# Altium integrated library myCPU_Components.IntLib: 73 symbols
Pins are listed as number, name and electrical type; pins without a type are passive.

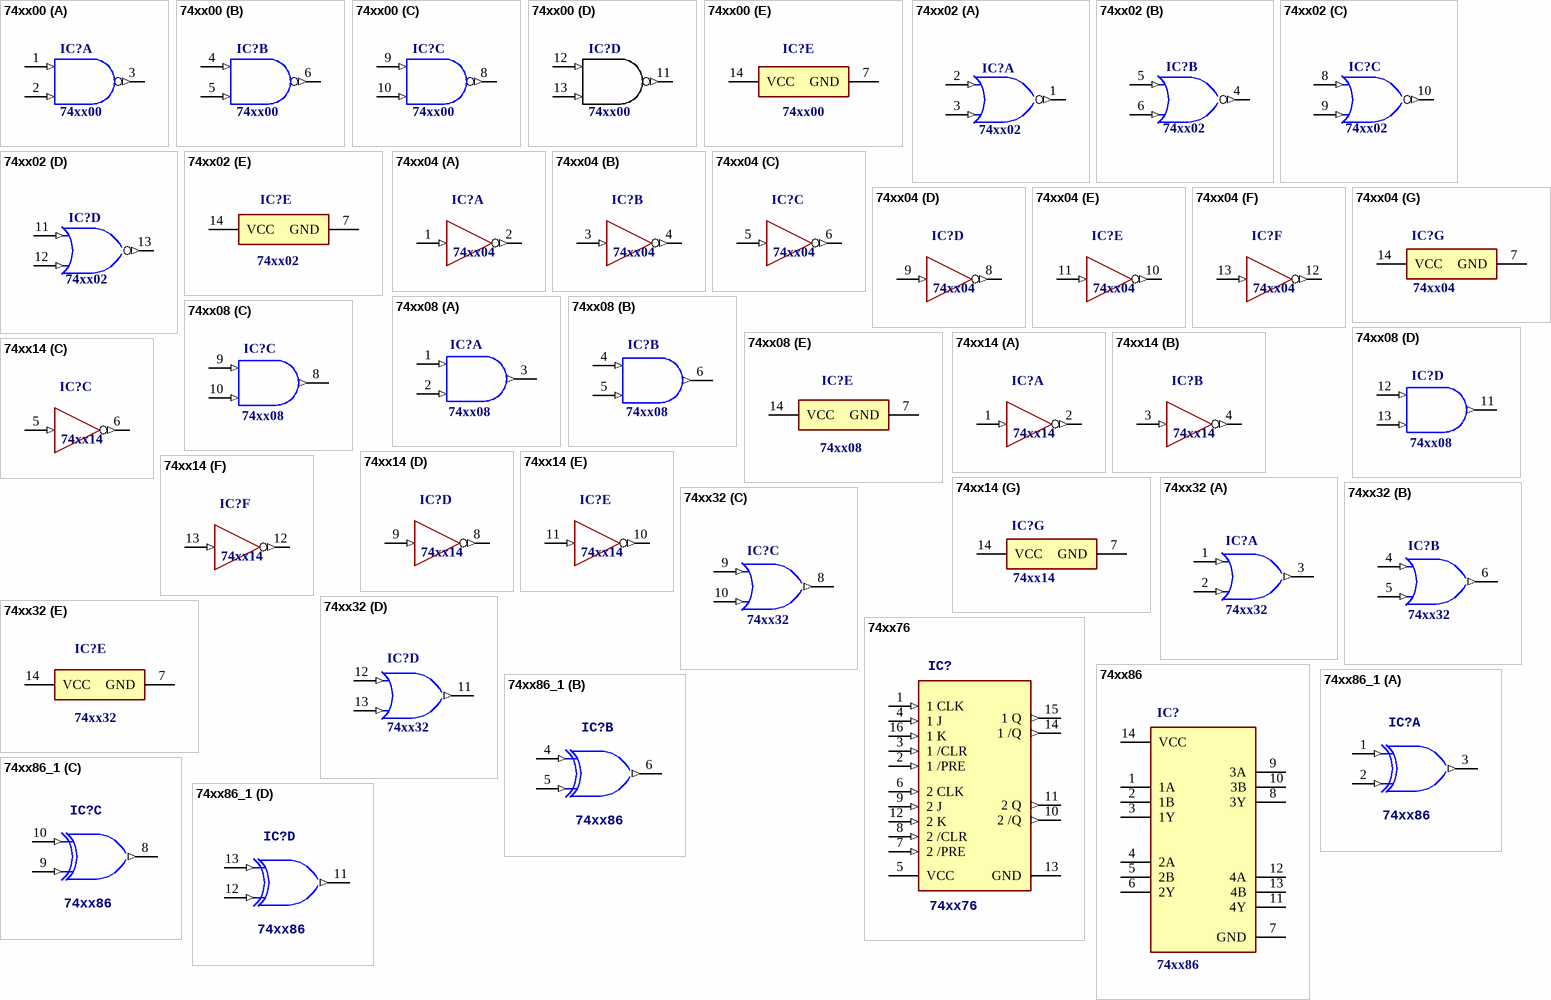
[diagram p0: symbols 74xx00 to 74xx86_1]

## 74xx00
designator IC?
Quad 2-input NAND gates; Value: 74xx00
footprint Generic_DIP14
part A pins: 1 1A (in) "Gate 1 input", 2 1B (in) "Gate 1 input", 3 1Y (out) "Gate 1 output"
part B pins: 4 2A (in) "Gate 2 input", 5 2B (in) "Gate 2 input", 6 2Y (out) "Gate 2 output"
part C pins: 8 3Y (out) "Gate 3 output", 9 3A (in) "Gate 3 input", 10 3B (in) "Gate 3 input"
part D pins: 11 4Y (out) "Gate 4 output", 12 4A (in) "Gate 4 input", 13 4B (in) "Gate 4 input"
part E pins: 7 GND (power) "Ground Pin", 14 VCC (power) "Power Pin"

## 74xx02
designator IC?
Quad 2-input NOR gates; Value: 74xx02
footprint Generic_DIP14
part A pins: 1 1Y (out) "1Y output", 2 1A (in) "1A input", 3 1B (in) "1B input"
part B pins: 4 2Y (out) "2Y output", 5 2A (in) "2A input", 6 2B (in) "2B input"
part C pins: 8 3A (in) "3A input", 9 3B (in) "3B input", 10 3Y (out) "3Y output"
part D pins: 11 4A (in) "4A input", 12 4B (in) "4B input", 13 4Y (out) "4Y output"
part E pins: 7 GND (power), 14 VCC (power)

## 74xx04
designator IC?
Hex inverters; Value: 74xx04
footprint Generic_DIP14
part A pins: 1 1A (in) "Input 1A", 2 ~{1Y} (out) "Output 1Y"
part B pins: 3 2A (in) "Input 2A", 4 ~{2Y} (out) "Output 2Y"
part C pins: 5 3A (in) "Input 3A", 6 ~{3Y} (out) "Output 3Y"
part D pins: 8 ~{4Y} (out) "Output 4Y", 9 4A (in) "Input 4A"
part E pins: 10 ~{5Y} (out) "Output 5Y", 11 5A (in) "Input 5A"
part F pins: 12 ~{6Y} (out) "Output 6Y", 13 6A (in) "Input 6A"
part G pins: 7 GND (power) "Ground Pin", 14 VCC (power) "Power Pin"

## 74xx08
designator IC?
Quad 2-input AND gates; Value: 74xx08
footprint Generic_DIP14
part A pins: 1 1A (in), 2 1B (in), 3 1Y (out)
part B pins: 4 2A (in), 5 2B (in), 6 2Y (out)
part C pins: 8 3Y (out), 9 3A (in), 10 3B (in)
part D pins: 11 4Y (out), 12 4A (in), 13 4B (in)
part E pins: 7 GND (power), 14 VCC (power)

## 74xx14
designator IC?
Hex inverters Schmitt Triggers; Value: 74xx14
footprint Generic_DIP14
part A pins: 1 1A (in) "Input 1A", 2 ~{1Y} (out) "Output 1Y"
part B pins: 3 2A (in) "Input 2A", 4 ~{2Y} (out) "Output 2Y"
part C pins: 5 3A (in) "Input 3A", 6 ~{3Y} (out) "Output 3Y"
part D pins: 8 ~{4Y} (out) "Output 4Y", 9 4A (in) "Input 4A"
part E pins: 10 ~{5Y} (out) "Output 5Y", 11 5A (in) "Input 5A"
part F pins: 12 ~{6Y} (out) "Output 6Y", 13 6A (in) "Input 6A"
part G pins: 7 GND (power) "Ground Pin", 14 VCC (power) "Power Pin"

## 74xx32
designator IC?
Quad 2-input OR gates.; Value: 74xx32
footprint Generic_DIP14
part A pins: 1 1A (in), 2 1B (in), 3 1Y (out)
part B pins: 4 2A (in), 5 2B (in), 6 2Y (out)
part C pins: 8 3Y (out), 9 3A (in), 10 3B (in)
part D pins: 11 4Y (out), 12 4A (in), 13 4B (in)
part E pins: 7 GND (power), 14 VCC (power)

## 74xx76
designator IC?
Dual J-K Flip Flop with clock, preset and clear; Value: 74xx76
footprint Generic_DIP16
pins: 1 1 CLK (in), 2 1 /PRE (in), 3 1 /CLR (in), 4 1 J (in), 5 VCC (power), 6 2 CLK (in), 7 2 /PRE (in), 8 2 /CLR (in), 9 2 J (in), 10 2 /Q (out), 11 2 Q (out), 12 2 K (in), 13 GND (power), 14 1 /Q (out), 15 1 Q (out), 16 1 K (in)

## 74xx86
designator IC?
Quad 2-input XOR gates; Value: 74xx86
footprint Generic_DIP14
pins: 1 1A, 2 1B, 3 1Y, 4 2A, 5 2B, 6 2Y, 7 GND, 8 3Y, 9 3A, 10 3B, 11 4Y, 12 4A, 13 4B, 14 VCC

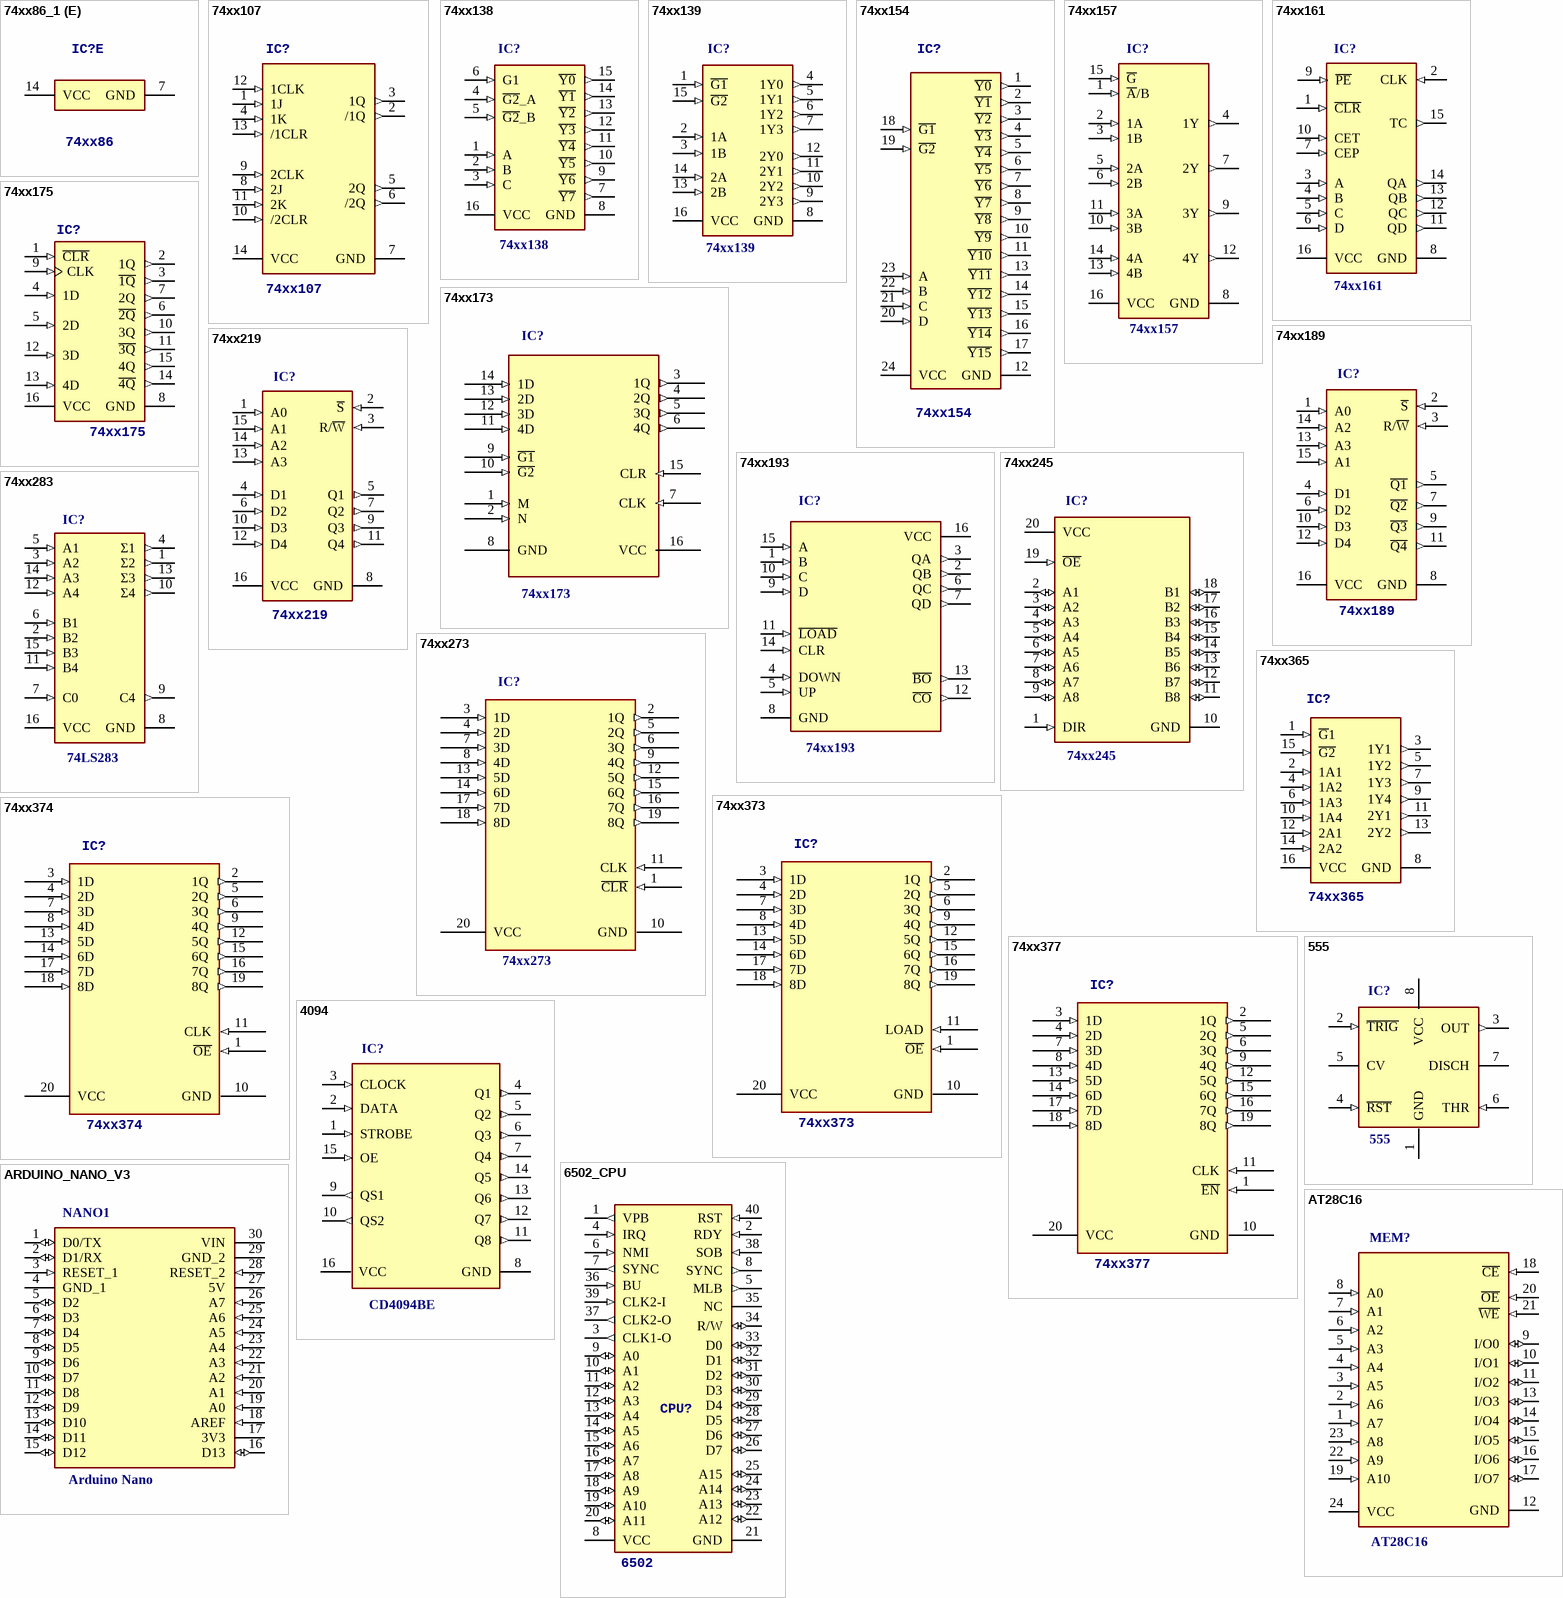
[diagram p1: symbols 74xx86_1 to AT28C16]

## 74xx86_1
designator IC?, comment 74xx86
Quad 2-input XOR gates; Value: 74xx86
footprint Generic_DIP14
part A pins: 1 1A (in), 2 1B (in), 3 1Y (out)
part B pins: 4 2A (in), 5 2B (in), 6 2Y (out)
part C pins: 8 3Y (out), 9 3B (in), 10 3A (in)
part D pins: 11 4Y (out), 12 4B (in), 13 4A (in)
part E pins: 7 GND (power), 14 VCC (power)

## 74xx107
designator IC?
Dual J/K Flip Flops with clock and clear; Value: 74xx107
footprint Generic_DIP14
pins: 1 1J (in), 2 /1Q (out), 3 1Q (out), 4 1K (in), 5 2Q (out), 6 /2Q (out), 7 GND (power), 8 2J (in), 9 2CLK (in), 10 /2CLR (in), 11 2K (in), 12 1CLK (in), 13 /1CLR (in), 14 VCC (power)

## 74xx138
designator IC?
3-Line to 8-Line decoder/demultiplexer; Value: 74xx138
footprint Generic_DIP16
pins: 1 A (in), 2 B (in), 3 C (in), 4 ~{G2}_A (in), 5 ~{G2}_B (in), 6 G1 (in), 7 ~{Y7} (out), 8 GND (power), 9 ~{Y6} (out), 10 ~{Y5} (out), 11 ~{Y4} (out), 12 ~{Y3} (out), 13 ~{Y2} (out), 14 ~{Y1} (out), 15 ~{Y0} (out), 16 VCC (power)

## 74xx139
designator IC?
Dual 2-to-4 Decoder/Demultiplexer; Value: 74xx139
footprint Generic_DIP16
pins: 1 ~{G1} (in), 2 1A (in), 3 1B (in), 4 1Y0 (out), 5 1Y1 (out), 6 1Y2 (out), 7 1Y3 (out), 8 GND (power), 9 2Y3 (out), 10 2Y2 (out), 11 2Y1 (out), 12 2Y0 (out), 13 2B (in), 14 2A (in), 15 ~{G2} (in), 16 VCC (power)

## 74xx154
designator IC?
4-Line to 16-Line decoder/demultiplexer; Value: 74LS138
footprint GENERIC_DIP24
pins: 1 ~{Y0} (out), 2 ~{Y1} (out), 3 ~{Y2} (out), 4 ~{Y3} (out), 5 ~{Y4} (out), 6 ~{Y5} (out), 7 ~{Y6} (out), 8 ~{Y7} (out), 9 ~{Y8} (out), 10 ~{Y9} (out), 11 ~{Y10} (out), 12 GND (power), 13 ~{Y11} (out), 14 ~{Y12} (out), 15 ~{Y13} (out), 16 ~{Y14} (out), 17 ~{Y15} (out), 18 ~{G1} (in), 19 ~{G2} (in), 20 D (in), 21 C (in), 22 B (in), 23 A (in), 24 VCC (power)

## 74xx157
designator IC?
4-Bits 2-Line to 1 Line data selector; Value: 74xx157
footprint Generic_DIP16 (DIP, 16-Leads, Body 19.7x6.6mm, Pitch 2.54mm)
pins: 1 ~{A}/B (in), 2 1A (in), 3 1B (in), 4 1Y (out), 5 2A (in), 6 2B (in), 7 2Y (out), 8 GND (power), 9 3Y (out), 10 3B (in), 11 3A (in), 12 4Y (out), 13 4B (in), 14 4A (in), 15 ~{G} (in), 16 VCC (power)

## 74xx161
designator IC?
4-Bit sync counter; Value: 74xx161
footprint Generic_DIP16 (DIP, 16-Leads, Body 19.7x6.6mm, Pitch 2.54mm)
footprint Generic_SMT16
pins: 1 ~{CLR} (in), 2 CLK (in), 3 A (in), 4 B (in), 5 C (in), 6 D (in), 7 CEP (in), 8 GND (power), 9 ~{PE} (in), 10 CET (in), 11 QD (out), 12 QC (out), 13 QB (out), 14 QA (out), 15 TC (out), 16 VCC (power)

## 74xx173
designator IC?
4-bit D-Type Register with 3 state outputs; Value: 74xx173
footprint Generic_DIP16 (DIP, 16-Leads, Body 19.7x6.6mm, Pitch 2.54mm)
pins: 1 M (in), 2 N (in), 3 1Q (out), 4 2Q (out), 5 3Q (out), 6 4Q (out), 7 CLK (in), 8 GND (power), 9 ~{G1} (in), 10 ~{G2} (in), 11 4D (in), 12 3D (in), 13 2D (in), 14 1D (in), 15 CLR (in), 16 VCC (power)

## 74xx175
designator IC?
Quad D-Type flip-flops with clear; Value: 74xx175
footprint Generic_DIP16
pins: 1 ~{CLR} (in), 2 1Q (out), 3 ~{1Q} (out), 4 1D (in), 5 2D (in), 6 ~{2Q} (out), 7 2Q (out), 8 GND (power), 9 CLK (in), 10 3Q (out), 11 ~{3Q} (out), 12 3D (in), 13 4D (in), 14 ~{4Q} (out), 15 4Q (out), 16 VCC (power)

## 74xx189
designator IC?
SRAM 16x1 inverted outputs; Value: 74xx189
footprint Generic_DIP16 (DIP, 16-Leads, Body 19.7x6.6mm, Pitch 2.54mm)
pins: 1 A0 (in), 2 ~{S} (in), 3 R/~{W} (in), 4 D1 (in), 5 ~{Q1} (out), 6 D2 (in), 7 ~{Q2} (out), 8 GND (power), 9 ~{Q3} (out), 10 D3 (in), 11 ~{Q4} (out), 12 D4 (in), 13 A3 (in), 14 A2 (in), 15 A1 (in), 16 VCC (power)

## 74xx193
designator IC?
Up/Down 4-bit binary counter; Value: 74xx193
footprint Generic_DIP16
pins: 1 B (in), 2 QB (out), 3 QA (out), 4 DOWN (in), 5 UP (in), 6 QC (out), 7 QD (out), 8 GND (power), 9 D (in), 10 C (in), 11 ~{LOAD} (in), 12 ~{CO} (out), 13 ~{BO} (out), 14 CLR (in), 15 A (in), 16 VCC (power)

## 74xx219
designator IC?
SRAM 16x1 non inverted outputs; Value: 74xx219
footprint Generic_DIP16 (DIP, 16-Leads, Body 19.7x6.6mm, Pitch 2.54mm)
pins: 1 A0 (in), 2 ~{S} (in), 3 R/~{W} (in), 4 D1 (in), 5 Q1 (out), 6 D2 (in), 7 Q2 (out), 8 GND (power), 9 Q3 (out), 10 D3 (in), 11 Q4 (out), 12 D4 (in), 13 A3 (in), 14 A2 (in), 15 A1 (in), 16 VCC (power)

## 74xx245
designator IC?
Non inverting bus transceiver; Value: 74xx245
footprint GENERIC_DIP20
footprint GENERIC_SMT20
pins: 1 DIR (in), 2 A1 (io), 3 A2 (io), 4 A3 (io), 5 A4 (io), 6 A5 (io), 7 A6 (io), 8 A7 (io), 9 A8 (io), 10 GND (power), 11 B8 (io), 12 B7 (io), 13 B6 (io), 14 B5 (io), 15 B4 (io), 16 B3 (io), 17 B2 (io), 18 B1 (io), 19 ~{OE} (in), 20 VCC (power)

## 74xx273
designator IC?
8-bit D-Type Register with 3 state outputs; Value: 74xx273
footprint Generic_DIP20
pins: 1 ~{CLR} (in), 2 1Q (out), 3 1D (in), 4 2D (in), 5 2Q (out), 6 3Q (out), 7 3D (in), 8 4D (in), 9 4Q (out), 10 GND (power), 11 CLK (in), 12 5Q (out), 13 5D (in), 14 6D (in), 15 6Q (out), 16 7Q (out), 17 7D (in), 18 8D (in), 19 8Q (out), 20 VCC (power)

## 74xx283
designator IC?, comment 74LS283
4-Bits Full adder with fast carry; Value: 74xx283
footprint Generic_DIP16 (DIP, 16-Leads, Body 19.7x6.6mm, Pitch 2.54mm)
pins: 1 Σ2 (out), 2 B2 (in), 3 A2 (in), 4 Σ1 (out), 5 A1 (in), 6 B1 (in), 7 C0 (in), 8 GND (power), 9 C4 (out), 10 Σ4 (out), 11 B4 (in), 12 A4 (in), 13 Σ3 (out), 14 A3 (in), 15 B3 (in), 16 VCC (power)

## 74xx365
designator IC?
Hex BUS drivers with 3-state outputs; Value: 74xx365
footprint Generic_DIP16
pins: 1 ~{G}1 (in), 2 1A1 (in), 3 1Y1 (out), 4 1A2 (in), 5 1Y2 (out), 6 1A3 (in), 7 1Y3 (out), 8 GND (power), 9 1Y4 (out), 10 1A4 (in), 11 2Y1 (out), 12 2A1 (in), 13 2Y2 (out), 14 2A2 (in), 15 ~{G2} (in), 16 VCC (power)

## 74xx373
designator IC?
8-bit D-Type Register with 3 state outputs; Value: 74xx373
footprint Generic_DIP20
pins: 1 ~{OE} (in), 2 1Q (out), 3 1D (in), 4 2D (in), 5 2Q (out), 6 3Q (out), 7 3D (in), 8 4D (in), 9 4Q (out), 10 GND (power), 11 LOAD (in), 12 5Q (out), 13 5D (in), 14 6D (in), 15 6Q (out), 16 7Q (out), 17 7D (in), 18 8D (in), 19 8Q (out), 20 VCC (power)

## 74xx374
designator IC?
8-bit edge triggered D-Type Register with 3 state outputs; Value: 74xx374
footprint Generic_DIP20
pins: 1 ~{OE} (in), 2 1Q (out), 3 1D (in), 4 2D (in), 5 2Q (out), 6 3Q (out), 7 3D (in), 8 4D (in), 9 4Q (out), 10 GND (power), 11 CLK (in), 12 5Q (out), 13 5D (in), 14 6D (in), 15 6Q (out), 16 7Q (out), 17 7D (in), 18 8D (in), 19 8Q (out), 20 VCC (power)

## 74xx377
designator IC?
8-bit D-Type Register with 3 state outputs and enable.; Value: 74xx377
footprint Generic_DIP20
pins: 1 ~{EN} (in), 2 1Q (out), 3 1D (in), 4 2D (in), 5 2Q (out), 6 3Q (out), 7 3D (in), 8 4D (in), 9 4Q (out), 10 GND (power), 11 CLK (in), 12 5Q (out), 13 5D (in), 14 6D (in), 15 6Q (out), 16 7Q (out), 17 7D (in), 18 8D (in), 19 8Q (out), 20 VCC (power)

## 555
designator IC?
555 Timer; Value: 555
footprint GENERIC_DIP8
pins: 1 GND (power), 2 ~{TRIG} (in), 3 OUT (out), 4 ~{RST} (in), 5 CV, 6 THR (in), 7 DISCH (oc), 8 VCC (power)

## 4094
designator IC?, comment CD4094BE
CMOS 8 bits shift register,3 state; Value: CD4094BE
footprint Generic_DIP16
pins: 1 STROBE (in), 2 DATA (in), 3 CLOCK (in), 4 Q1 (out), 5 Q2 (out), 6 Q3 (out), 7 Q4 (out), 8 GND (power), 9 QS1 (out), 10 QS2 (out), 11 Q8 (out), 12 Q7 (out), 13 Q6 (out), 14 Q5 (out), 15 OE (in), 16 VCC (power)

## 6502_CPU
designator CPU?, comment 6502
footprint CPU_DIP40_W
pins: 1 VPB (out), 2 RDY (in), 3 CLK1-O (out), 4 IRQ (in), 5 MLB (out), 6 NMI (in), 7 SYNC (out), 8 VCC (power), 8 SYNC (out), 9 A0 (io), 10 A1 (io), 11 A2 (io), 12 A3 (io), 13 A4 (io), 14 A5 (io), 15 A6 (io), 16 A7 (io), 17 A8 (io), 18 A9 (io), 19 A10 (io), 20 A11 (io), 21 GND (power), 22 A12 (io), 23 A13 (io), 24 A14 (io), 25 A15 (io), 26 D7 (io), 27 D6 (io), 28 D5 (io), 29 D4 (io), 30 D3 (io), 31 D2 (io), 32 D1 (io), 33 D0 (io), 34 R/W (io), 35 NC, 36 BU (in), 37 CLK2-O (out), 38 SOB (in), 39 CLK2-I (in), 40 RST (in)

## ARDUINO_NANO_V3
designator NANO1, comment Arduino Nano
Arduino NANO v3; Value: ARDUINO_NANO_V3
footprint ARDUINO_NANO_V3
pins: 1 D0/TX (io), 2 D1/RX (io), 3 RESET_1 (in), 4 GND_1 (power), 5 D2 (io), 6 D3 (io), 7 D4 (io), 8 D5 (io), 9 D6 (io), 10 D7 (io), 11 D8 (io), 12 D9 (io), 13 D10 (io), 14 D11 (io), 15 D12 (io), 16 D13 (io), 17 3V3 (power), 18 AREF (in), 19 A0 (in), 20 A1 (in), 21 A2 (in), 22 A3 (in), 23 A4 (in), 24 A5 (in), 25 A6 (in), 26 A7 (in), 27 5V (power), 28 RESET_2 (in), 29 GND_2 (power), 30 VIN (power)

## AT28C16
designator MEM?
EEProm 16K, 2K x 8 bits; Value: AT28C16
footprint GENERIC_DIP24_W
pins: 1 A7 (in), 2 A6 (in), 3 A5 (in), 4 A4 (in), 5 A3 (in), 6 A2 (in), 7 A1 (in), 8 A0 (in), 9 I/O0 (io), 10 I/O1 (io), 11 I/O2 (io), 12 GND (power), 13 I/O3 (io), 14 I/O4 (io), 15 I/O5 (io), 16 I/O6 (io), 17 I/O7 (io), 18 ~{CE} (in), 19 A10 (in), 20 ~{OE} (in), 21 ~{WE} (in), 22 A9 (in), 23 A8 (in), 24 VCC (power)

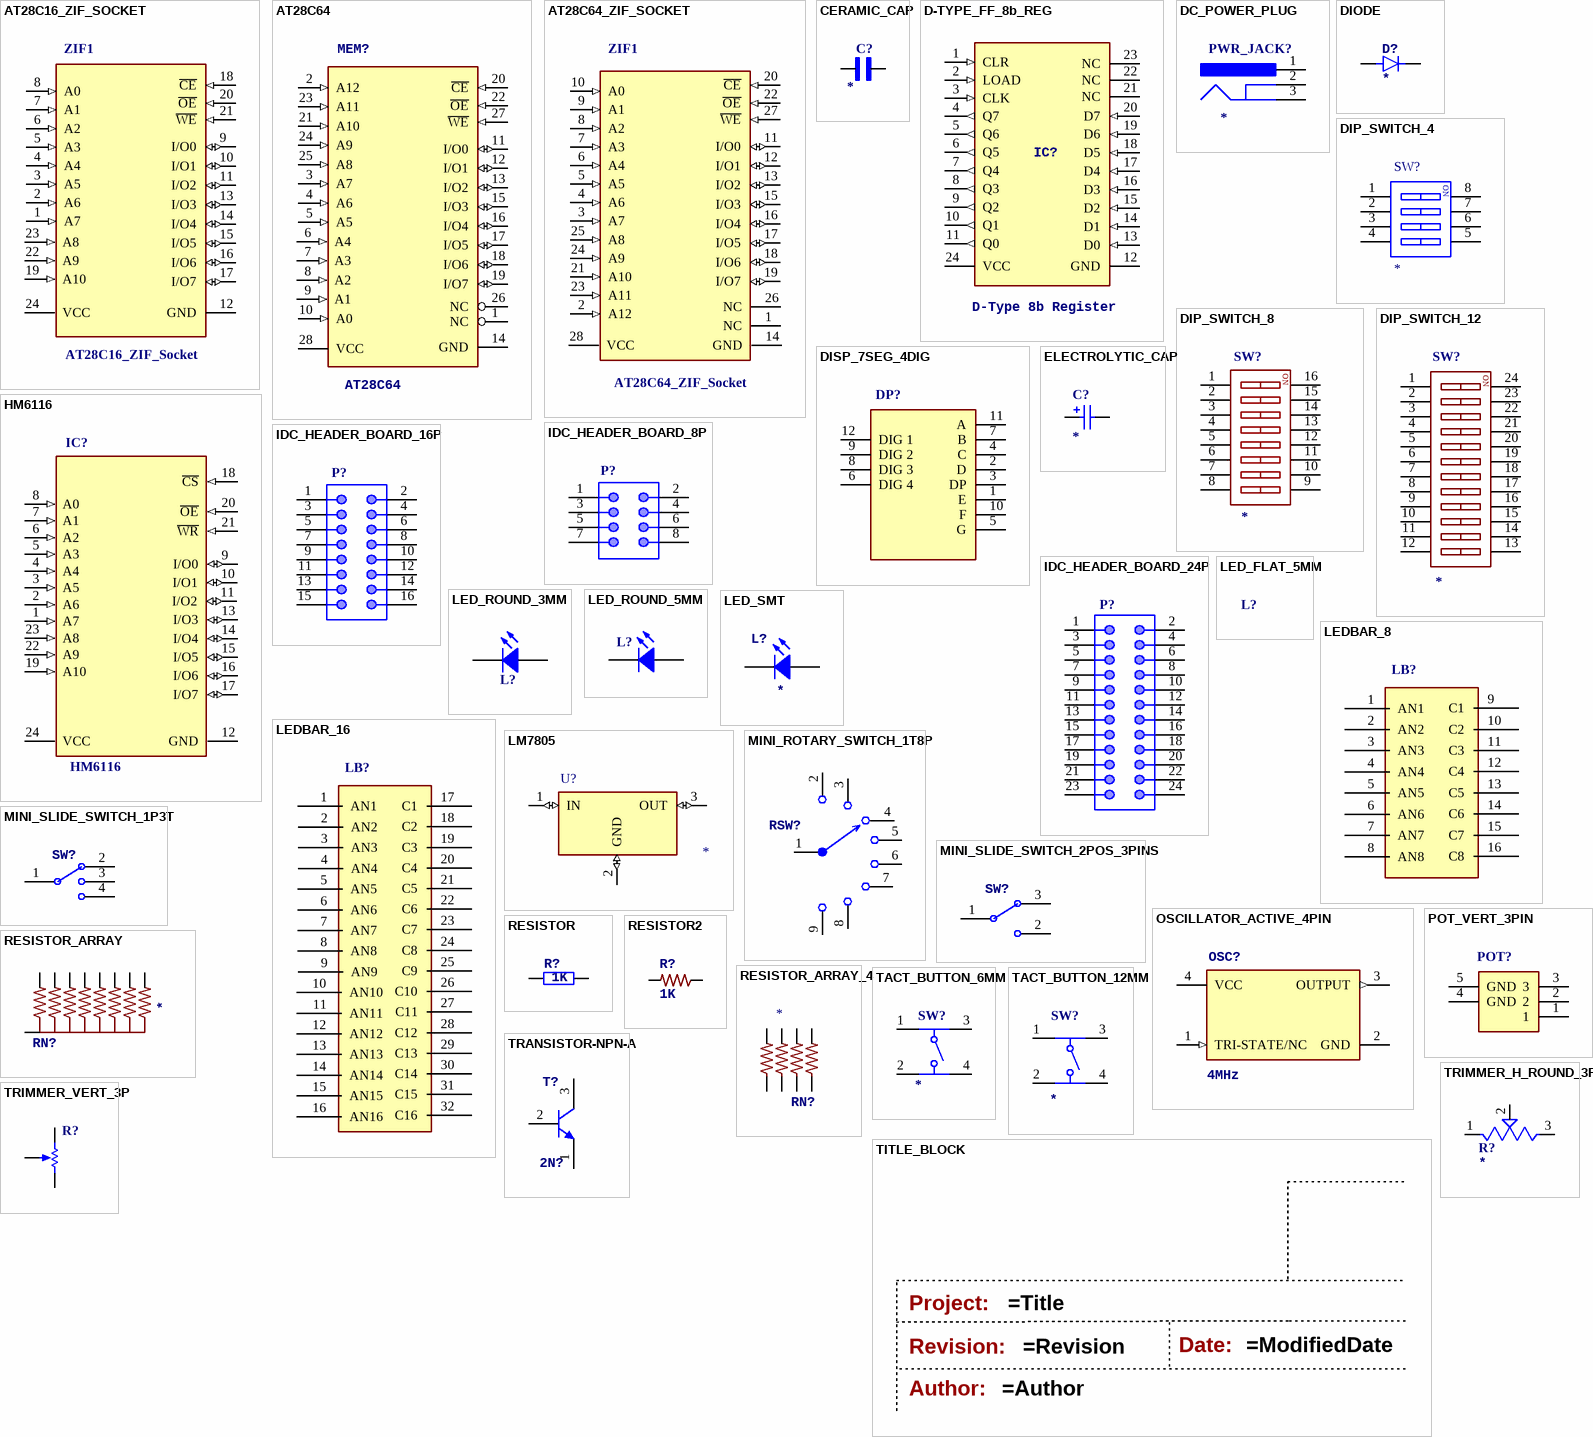
[diagram p2: symbols AT28C16_ZIF_SOCKET to TRIMMER_VERT_3P]

## AT28C16_ZIF_SOCKET
designator ZIF1, comment AT28C16_ZIF_Socket
AT28C64 ZIF Socket; Value: ZIF socket 28W
footprint ZIF_SOCKET_28W
pins: 1 A7 (in), 2 A6 (in), 3 A5 (in), 4 A4 (in), 5 A3 (in), 6 A2 (in), 7 A1 (in), 8 A0 (in), 9 I/O0 (io), 10 I/O1 (io), 11 I/O2 (io), 12 GND (power), 13 I/O3 (io), 14 I/O4 (io), 15 I/O5 (io), 16 I/O6 (io), 17 I/O7 (io), 18 ~{CE} (in), 19 A10 (in), 20 ~{OE} (in), 21 ~{WE} (in), 22 A9 (in), 23 A8 (in), 24 VCC (power)

## AT28C64
designator MEM?
EEProm 64K, 8K x 8 bits; Value: AT28C64
footprint GENERIC_DIP28_W
footprint ZIF_SOCKET_28W
pins: 1 NC, 2 A12 (in), 3 A7 (in), 4 A6 (in), 5 A5 (in), 6 A4 (in), 7 A3 (in), 8 A2 (in), 9 A1 (in), 10 A0 (in), 11 I/O0 (io), 12 I/O1 (io), 13 I/O2 (io), 14 GND (power), 15 I/O3 (io), 16 I/O4 (io), 17 I/O5 (io), 18 I/O6 (io), 19 I/O7 (io), 20 ~{CE} (in), 21 A10 (in), 22 ~{OE} (in), 23 A11 (in), 24 A9 (in), 25 A8 (in), 26 NC, 27 ~{WE} (in), 28 VCC (power)

## AT28C64_ZIF_SOCKET
designator ZIF1, comment AT28C64_ZIF_Socket
AT28C64 ZIF Socket; Value: ZIF socket 28W
footprint ZIF_SOCKET_28W
pins: 1 NC, 2 A12 (in), 3 A7 (in), 4 A6 (in), 5 A5 (in), 6 A4 (in), 7 A3 (in), 8 A2 (in), 9 A1 (in), 10 A0 (in), 11 I/O0 (io), 12 I/O1 (io), 13 I/O2 (io), 14 GND (power), 15 I/O3 (io), 16 I/O4 (io), 17 I/O5 (io), 18 I/O6 (io), 19 I/O7 (io), 20 ~{CE} (in), 21 A10 (in), 22 ~{OE} (in), 23 A11 (in), 24 A9 (in), 25 A8 (in), 26 NC, 27 ~{WE} (in), 28 VCC (power)

## CERAMIC_CAP
designator C?
Ceramic capacitor; Value: *
footprint CAP_CERAMIC
footprint CAP_CERAMIC_SMT_402
pins: 1, 2

## D-TYPE_FF_8b_REG
designator IC?, comment D-Type 8b Register
Value: D-Type 8b Register
footprint D-Type BASE_DIP24
pins: 1 CLR (in), 2 LOAD (in), 3 CLK (in), 4 Q7 (out), 5 Q6 (out), 6 Q5 (out), 7 Q4 (out), 8 Q3 (out), 9 Q2 (out), 10 Q1 (out), 11 Q0 (out), 12 GND (power), 13 D0 (in), 14 D1 (in), 15 D2 (in), 16 D3 (in), 17 D4 (in), 18 D5 (in), 19 D6 (in), 20 D7 (in), 21 NC (hiz), 22 NC (hiz), 23 NC (hiz), 24 VCC (power)

## DC_POWER_PLUG
designator PWR_JACK?
DC Power Jack, 2.5 A, 2 mm Center Pin, 3 Position, THT Right Angle; Value: *
footprint DC_POWER_JACK_2MM_ANGLED
pins: 1, 2, 3

## DIODE
designator D?
footprint DIODE
pins: A, C

## DIP_SWITCH_4
designator SW?
DIP switch 4 positions; Value: *
footprint DIP_SWITCH_4
pins: 1, 2, 3, 4, 5, 6, 7, 8
text: ON

## DIP_SWITCH_8
designator SW?
DIP switch 8 positions; Value: DIP switch 8 positions
footprint DIP_SWITCH_8
pins: 1, 2, 3, 4, 5, 6, 7, 8, 9, 10, 11, 12, 13, 14, 15, 16
text: ON

## DIP_SWITCH_12
designator SW?
DIP switch 12 positions; Value: DIP switch 12 positions
footprint DIP_SWITCH_12
pins: 1, 2, 3, 4, 5, 6, 7, 8, 9, 10, 11, 12, 13, 14, 15, 16, 17, 18, 19, 20, 21, 22, 23, 24
text: ON

## DISP_7SEG_4DIG
designator DP?  (value not drawn)
Display 7 segments 4 digits 0.36"; Value: Display 7 segments 4 digits 0.36"
footprint DISP_7S_4D_56
pins: 1 E, 2 D, 3 DP, 4 C, 5 G, 6 DIG 4, 7 B, 8 DIG 3, 9 DIG 2, 10 F, 11 A, 12 DIG 1

## ELECTROLYTIC_CAP
designator C?
Electrolytic capacitor 16v/50v; Value: *
footprint CAP_ELECTROLYTIC_RADIAL
footprint CAP_ELEC_SMT_B
pins: 1 P, 2 N

## HM6116
designator IC?
SRAM 64K x 1bit, 8K x 8 Bits; Value: HM6116
footprint GENERIC_DIP24_W
pins: 1 A7 (in), 2 A6 (in), 3 A5 (in), 4 A4 (in), 5 A3 (in), 6 A2 (in), 7 A1 (in), 8 A0 (in), 9 I/O0 (io), 10 I/O1 (io), 11 I/O2 (io), 12 GND (power), 13 I/O3 (io), 14 I/O4 (io), 15 I/O5 (io), 16 I/O6 (io), 17 I/O7 (io), 18 ~{CS} (in), 19 A10 (in), 20 ~{OE} (in), 21 ~{WR} (in), 22 A9 (in), 23 A8 (in), 24 VCC (power)

## IDC_HEADER_BOARD_8P
designator P?  (value not drawn)
IDC socket male 8 pins,2x4 odd-even; Value: IDC socket male 8 pins,2x4 odd-even
footprint IDC_HEADER_BOARD_8P
pins: 1, 2, 3, 4, 5, 6, 7, 8

## IDC_HEADER_BOARD_16P
designator P?  (value not drawn)
IDC socket male 16 pins, 2x8 odd-even; Value: IDC socket male 16 pins, 2x8 odd-even
footprint IDC_HEADER_BOARD_16P
pins: 1, 2, 3, 4, 5, 6, 7, 8, 9, 10, 11, 12, 13, 14, 15, 16

## IDC_HEADER_BOARD_24P
designator P?, comment IDC HEAD 24P  (value not drawn)
IDC socket male 24 pins,2x12 odd-even; Value: IDC socket male 24 pins,2x12 odd-even
footprint IDC_HEADER_BOARD_24P
pins: 1, 2, 3, 4, 5, 6, 7, 8, 9, 10, 11, 12, 13, 14, 15, 16, 17, 18, 19, 20, 21, 22, 23, 24

## LED_FLAT_5MM
designator L?  (value not drawn)
Led Flat 5mm; Value: Led Flat 5mm

## LED_ROUND_3MM
designator L?  (value not drawn)
Led 3mm Round; Value: Led 3mm Round
footprint LED_ROUND_3MM
pins: 1 K, 2 A

## LED_ROUND_5MM
designator L?  (value not drawn)
Led 5mm Round; Value: Led 5mm Round
footprint LED_ROUND_5MM
pins: 1 K, 2 A

## LED_SMT
designator L?
Value: *
footprint LED_SMT_603
pins: 1 K, 2 A

## LEDBAR_8
designator LB?  (value not drawn)
Led Indicator Bar 8 segments, DIP 16; Value: Led Indicator Bar 8 segments, DIP 16
footprint LED_Bar_8
pins: 1 AN1, 2 AN2, 3 AN3, 4 AN4, 5 AN5, 6 AN6, 7 AN7, 8 AN8, 9 C1, 10 C2, 11 C3, 12 C4, 13 C5, 14 C6, 15 C7, 16 C8

## LEDBAR_16
designator LB?  (value not drawn)
Led Indicator Bar 16 segments
footprint LED_Bar_16
pins: 1 AN1, 2 AN2, 3 AN3, 4 AN4, 5 AN5, 6 AN6, 7 AN7, 8 AN8, 9 AN9, 10 AN10, 11 AN11, 12 AN12, 13 AN13, 14 AN14, 15 AN15, 16 AN16, 17 C1, 18 C2, 19 C3, 20 C4, 21 C5, 22 C6, 23 C7, 24 C8, 25 C9, 26 C10, 27 C11, 28 C12, 29 C13, 30 C14, 31 C15, 32 C16

## LM7805
designator U?
5v/1A  Voltage Regulator; Value: *
footprint TO-220
pins: 1 IN (io), 2 GND (io), 3 OUT (io)

## MINI_ROTARY_SWITCH_1T8P
designator RSW?  (value not drawn)
Mini rotary switch 1T8P; Value: Rotary switch 1T8P
footprint ROTARY_SWITCH_1T8P
pins: 1 COM, 2, 3, 4, 5, 6, 7, 8, 9

## MINI_SLIDE_SWITCH_1P3T
designator SW?  (value not drawn)
Mini slide switch SP3T; Value: Mini slide switch SP3T
footprint MINI_SLIDE_SWITCH_1P3T
pins: 1 COM, 2, 3, 4

## MINI_SLIDE_SWITCH_2POS_3PINS
designator SW?  (value not drawn)
Mini slide switch 2 pos, 3 pins; Value: Mini slide switch 2 pos, 3 pins
footprint MINI_SLIDE_SWITCH_3PINS
footprint MINI_SLIDE_SWITCH_ANG_3T_2.0
footprint MINI_SLIDE_SWITCH_ANG_3T_2.54
pins: 1 COM, 2, 3

## OSCILLATOR_ACTIVE_4PIN
designator OSC?, comment 4MHz
Active Crystal Oscillator 4Pin; Value: 4 MHz
footprint CRYSTAL_OSCILLATOR_SQUARE
pins: 1 TRI-STATE/NC (in), 2 GND (power), 3 OUTPUT (out), 4 VCC (power)

## POT_VERT_3PIN
designator POT?  (value not drawn)
Potentiometer vertical, rotary, 3pins; Value: Potentiometer vertical, rotary, 3pins
footprint POT_VERT_3PIN
pins: 1, 2, 3, 4 GND, 5 GND

## RESISTOR
designator R?  value 1K  (hidden comment: *)
Resistor axial
footprint RESISTOR
pins: 1, 2

## RESISTOR2
designator R?  value 1K  (hidden comment: *)
Resistor Axial
footprint RESISTOR
pins: 1, 2

## RESISTOR_ARRAY
designator RN?
Resistor array 8 elements,9 pins; Value: *
footprint RESISTOR_ARRAY
pins: 1, 2, 3, 4, 5, 6, 7, 8, C

## RESISTOR_ARRAY_4
designator RN?
Resistor Array 4 resistors; Value: *
footprint RESISTOR_ARRAY_4_SMT
pins: 1, 2, 3, 4, 5, 6, 7, 8

## TACT_BUTTON_6MM
designator SW?
Tactile button 6 mm; Value: *
footprint TACT_BUTTON_6MM
pins: 1, 2, 3, 4

## TACT_BUTTON_12MM
designator SW?
Tactile button 12 mm; Value: *
footprint TACT_BUTTON_12MM
pins: 1, 2, 3, 4

## TITLE_BLOCK
designator *  (value not drawn)
text: Project:; Revision:; Date:; Author:

## TRANSISTOR-NPN-A
designator T?, comment 2N?
footprint TRANSISTOR_NPN_A
pins: 1 E, 2 B, 3 C

## TRIMMER_H_ROUND_3P
designator R?
Vertical variable resistor 3 pins; Value: *
footprint TRIMMER_H_ROUND_3P
pins: 1 CCW, 2 W, 3 CW

## TRIMMER_VERT_3P
designator R?, comment Trimmer 3pin  (value not drawn)
Trimmer resistor 3 pin; Value: *
footprint TRIMMER_RESISTOR_3PIN
pins: 1 CCW, 2 S, 3 CW

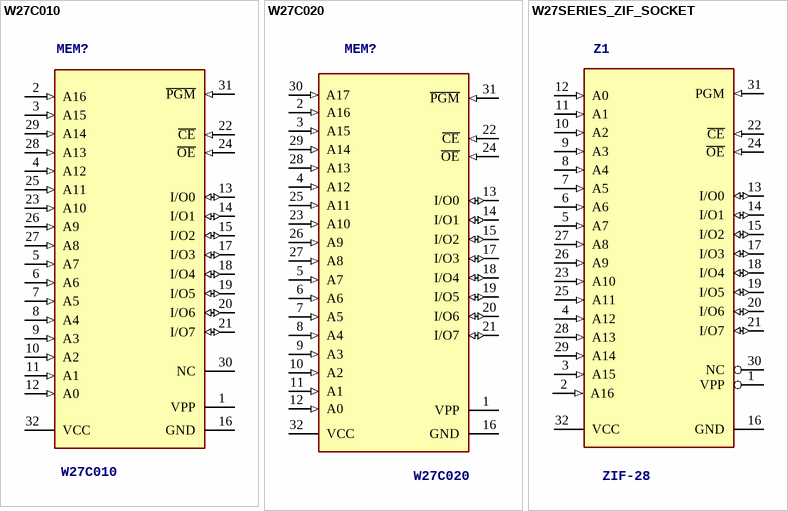
[diagram p3: symbols W27C010 to W27SERIES_ZIF_SOCKET]

## W27C010
designator MEM?
SRAM 128K x 8; Value: W27C010
footprint GENERIC_DIP32_W
footprint PLCC-32
pins: 1 VPP (power), 2 A16 (in), 3 A15 (in), 4 A12 (in), 5 A7 (in), 6 A6 (in), 7 A5 (in), 8 A4 (in), 9 A3 (in), 10 A2 (in), 11 A1 (in), 12 A0 (in), 13 I/O0 (io), 14 I/O1 (io), 15 I/O2 (io), 16 GND (power), 17 I/O3 (io), 18 I/O4 (io), 19 I/O5 (io), 20 I/O6 (io), 21 I/O7 (io), 22 ~{CE} (in), 23 A10 (in), 24 ~{OE} (in), 25 A11 (in), 26 A9 (in), 27 A8 (in), 28 A13 (in), 29 A14 (in), 30 NC, 31 ~{PGM} (in), 32 VCC (power)

## W27C020
designator MEM?
SRAM 256K x 8
footprint PLCC-32
pins: 1 VPP (power), 2 A16 (in), 3 A15 (in), 4 A12 (in), 5 A7 (in), 6 A6 (in), 7 A5 (in), 8 A4 (in), 9 A3 (in), 10 A2 (in), 11 A1 (in), 12 A0 (in), 13 I/O0 (io), 14 I/O1 (io), 15 I/O2 (io), 16 GND (power), 17 I/O3 (io), 18 I/O4 (io), 19 I/O5 (io), 20 I/O6 (io), 21 I/O7 (io), 22 ~{CE} (in), 23 A10 (in), 24 ~{OE} (in), 25 A11 (in), 26 A9 (in), 27 A8 (in), 28 A13 (in), 29 A14 (in), 30 A17 (in), 31 ~{PGM} (in), 32 VCC (power)

## W27SERIES_ZIF_SOCKET
designator Z1, comment ZIF-28
W27 series ZIF socket
pins: 1 VPP, 2 A16 (in), 3 A15 (in), 4 A12 (in), 5 A7 (in), 6 A6 (in), 7 A5 (in), 8 A4 (in), 9 A3 (in), 10 A2 (in), 11 A1 (in), 12 A0 (in), 13 I/O0 (io), 14 I/O1 (io), 15 I/O2 (io), 16 GND (power), 17 I/O3 (io), 18 I/O4 (io), 19 I/O5 (io), 20 I/O6 (io), 21 I/O7 (io), 22 ~{CE} (in), 23 A10 (in), 24 ~{OE} (in), 25 A11 (in), 26 A9 (in), 27 A8 (in), 28 A13 (in), 29 A14 (in), 30 NC, 31 PGM (in), 32 VCC (power)